# Altium footprint library Elettronica FM.PcbLib: 387 footprints (part 11 of 25)
Each footprint in its own frame and in the unit in brackets; x right, y up, seen from the top. Pads: shape width x height; smd on the part's side, far side on the other; paste and mask are expansions set on the pad; w line width, h text height; cw(c..) or ccw(c..) is an arc to the next point about the centre after c.
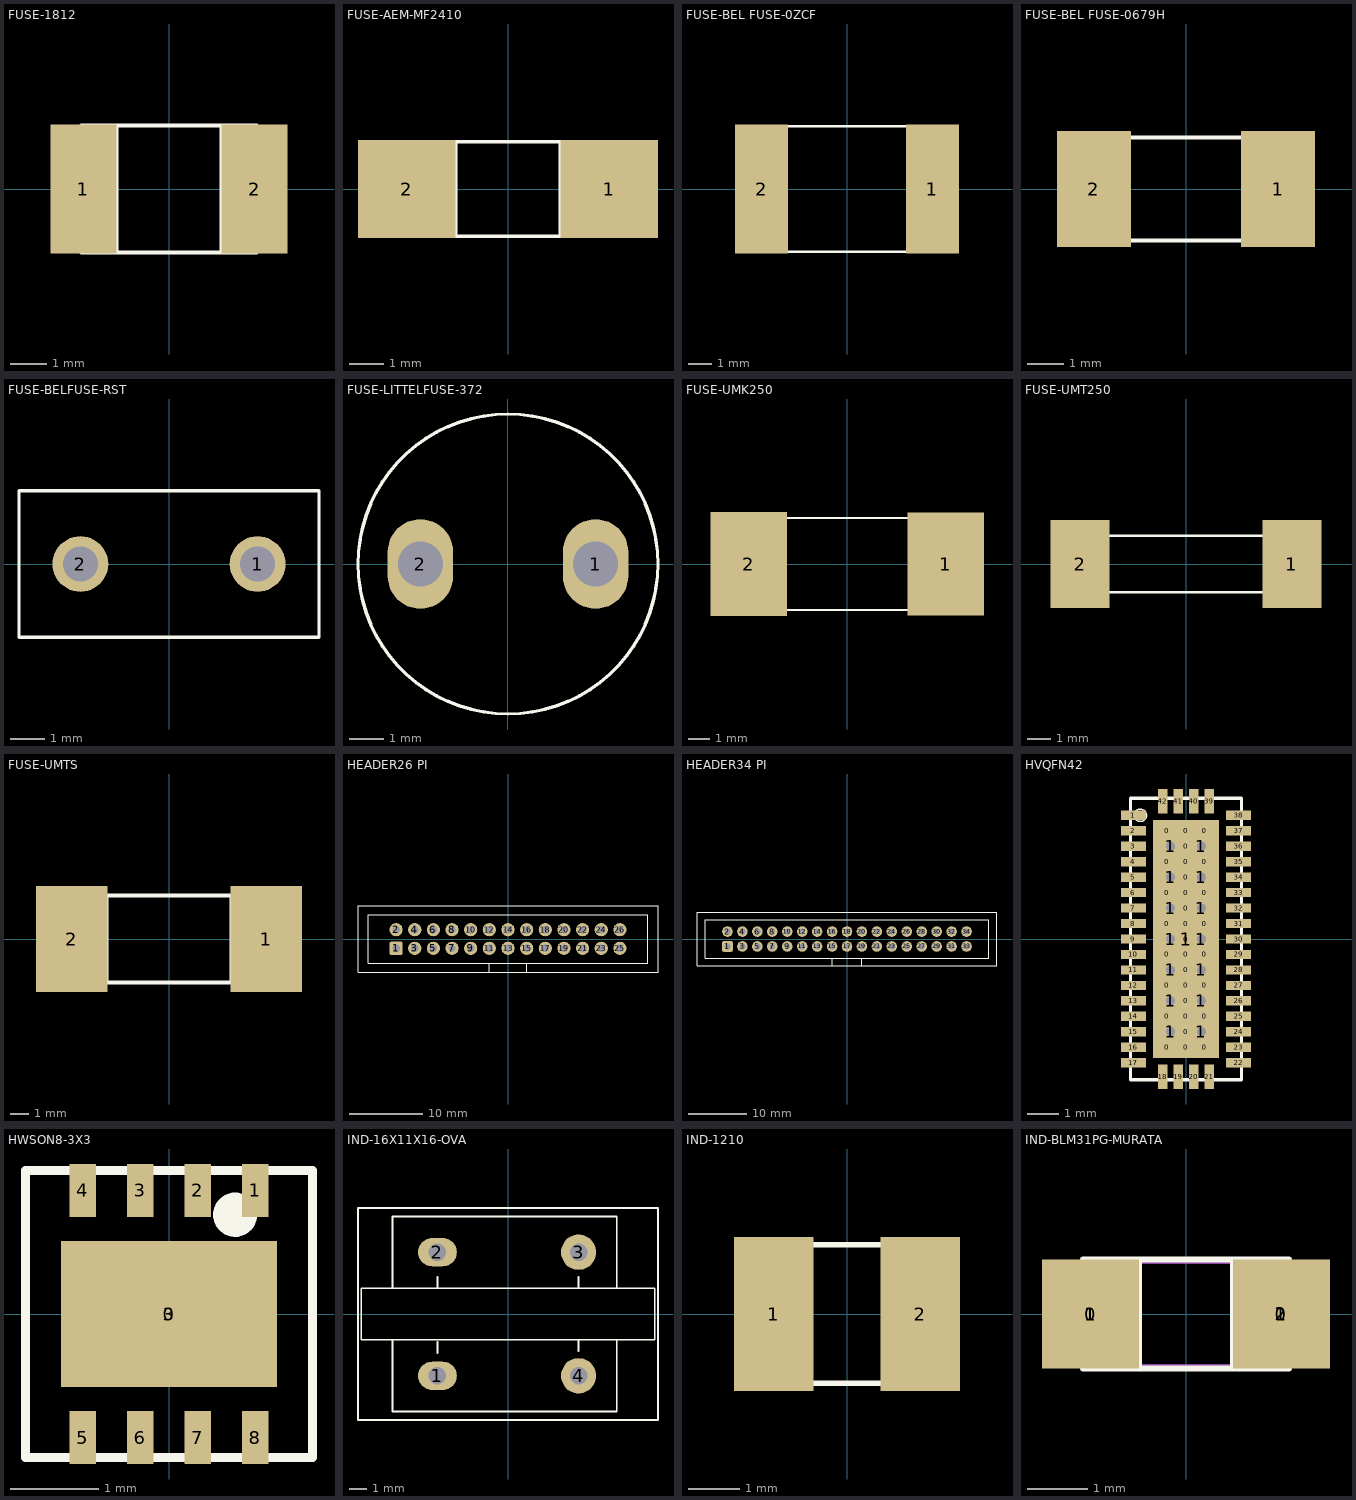
[diagram p10: the footprints below, top view; thin cyan lines are the x and y axes]

## FUSE-1812 [mm]
height 16.6
pads (2):
  rect 1.8x3.5 smd paste-0.05: 1(-2.325,0) 2(2.325,0)
Top Overlay:
  lines w0.1: -1.425,-1.725 -1.425,1.725 ; 1.425,-1.725 1.425,1.725 ; -2.375,-1.725 2.375,-1.725 2.375,1.725 -2.375,1.725 -2.375,-1.725

## FUSE-AEM-MF2410 [mm]
height 1.9
pads (2):
  rect 2.8x2.8 smd: 1(2.9,0) 2(-2.9,0)
Top Overlay:
  lines w0.1: -1.5,-1.35 -1.5,1.35 ; 1.5,-1.35 1.5,1.35 ; -3.15,-1.35 3.15,-1.35 3.15,1.35 -3.15,1.35 -3.15,-1.35
3D body: height 2.4, standoff 0, extent -3.15,-1.35 3.15,1.35

## FUSE-BEL FUSE-0ZCF [mm]
height 1.9
pads (2):
  rect 2.3x5.6 smd: 1(3.7,0) 2(-3.7,0)
Top Overlay:
  lines w0.1: -2.8,-2.725 -2.8,2.725 ; 2.8,-2.725 2.8,2.725 ; -4,-2.725 4,-2.725 4,-0.9 cw(c4,0) 4,0.9 4,2.725 -4,2.725 -4,0.9 cw(c-4,0) -4,-0.9 -4,-2.725
3D body: height 1.15, standoff 0, extent -4,-2.725 4,2.725
3D body: height 1.17, standoff 0, extent 2.8,-2.75 4.025,2.75
3D body: height 1.17, standoff 0, extent -4.025,-2.75 -2.8,2.75

## FUSE-BEL FUSE-0679H [mm]
height 1.9
pads (2):
  rect 2x3.15 smd: 1(2.5,0) 2(-2.5,0)
Top Overlay:
  lines w0.1: -1.55,-1.4 -1.55,1.4 ; 1.55,-1.4 1.55,1.4 ; -3.2,-1.4 3.2,-1.4 3.2,1.4 -3.2,1.4 -3.2,-1.4
3D body: height 2.8, standoff 0, extent -3.15,-1.35 3.15,1.35

## FUSE-BELFUSE-RST [mm]
height 8.5
pads (2):
  round 1.6 hole 1: 1(2.54,0) 2(-2.54,0)
Top Overlay:
  lines w0.1: -4.3,-2.1 -4.3,2.1 4.3,2.1 4.3,-2.1 -4.3,-2.1
3D body: height 0.7, standoff -4.3, extent -3.085,-0.549 -1.99,0.549
3D body: height 0.7, standoff -4.3, extent 1.995,-0.549 3.09,0.549

## FUSE-LITTELFUSE-372 [mm]
height 8.5
pads (2):
  oval 1.9x2.6 hole 1.3: 1(2.54,0) 2(-2.54,0)
Top Overlay:
  circle w0.1: c0,0 r4.35
3D body: height 0.7, standoff -4.3, extent -3.085,-0.549 -1.99,0.549
3D body: height 0.7, standoff -4.3, extent 1.995,-0.549 3.09,0.549
3D body: height 8, standoff 0.5, extent -4.35,-4.347 4.35,4.347

## FUSE-UMK250 [mm]
pads (2):
  rect 3.5x4.7 smd: 1(4.5,0)
  rect 3.5x4.75 smd: 2(-4.5,0)
Top Overlay:
  lines w0.1: -5.65,-2.1 5.65,-2.1 5.65,2.1 -5.65,2.1 -5.65,-2.1
3D body "UMK250.STEP": height 4.02, standoff 0.02, extent -5.65,-2.1 5.65,2.1

## FUSE-UMT250 [mm]
pads (2):
  rect 2.5x3.75 smd: 1(4.5,0) 2(-4.5,0)
Top Overlay:
  lines w0.1: -3.45,-1.2 3.45,-1.2 ; -3.45,1.2 3.45,1.2 ; -5.45,-0.7 -5.05,-0.7 -5.05,0.7 -5.45,0.7 -5.45,-0.7 ; -5.05,-1.5 -5.05,1.5 -3.45,1.5 -3.45,-1.5 -5.05,-1.5 ; 3.45,-1.5 3.45,1.5 5.05,1.5 5.05,-1.5 3.45,-1.5 ; 5.05,-0.7 5.05,0.7 5.45,0.7 5.45,-0.7 5.05,-0.7
3D body "UMT250.STEP": height 3, standoff 0, extent -5.45,-1.5 5.45,1.5

## FUSE-UMTS [mm]
pads (2):
  rect 3.8x5.6 smd: 1(5.15,0) 2(-5.15,0)
Top Overlay:
  lines w0.2: -3.3,-2.3 -3.3,2.3 ; 3.3,-2.3 3.3,2.3 ; -6.1,-2.3 6.1,-2.3 6.1,2.3 -6.1,2.3 -6.1,-2.3

## HEADER26 PI [mm]
pads (26):
  rrect25% 1.8x1.8 hole 1: 1(-15.24,-1.27)
  round 1.8 hole 1: 2(-15.24,1.27) 3(-12.7,-1.27) 4(-12.7,1.27) 5(-10.16,-1.27) 6(-10.16,1.27) 7(-7.62,-1.27) 8(-7.62,1.27) 9(-5.08,-1.27) 10(-5.08,1.27) 11(-2.54,-1.27) 12(-2.54,1.27) 13(0,-1.27) 14(0,1.27) 15(2.54,-1.27) 16(2.54,1.27) 17(5.08,-1.27) 18(5.08,1.27) 19(7.62,-1.27) 20(7.62,1.27) 21(10.16,-1.27) 22(10.16,1.27) 23(12.7,-1.27) 24(12.7,1.27) 25(15.24,-1.27) 26(15.24,1.27)
Top Overlay:
  lines w0.1: -2.54,-4.55 2.54,-4.55 ; -2.54,-4.55 -20.425,-4.55 -20.425,4.55 20.425,4.55 20.425,-4.55 2.54,-4.55 ; -2.54,-4.55 -2.54,-3.302 2.54,-3.302 2.54,-4.55 ; -19.05,-3.302 -8.89,-3.302 19.05,-3.302 19.05,3.302 -19.05,3.302 -19.05,-3.302
3D body "702462601.stp": height 9.25, standoff -3.44, extent -20.32,-4.445 20.32,4.445

## HEADER34 PI [mm]
pads (34):
  rrect25% 1.8x1.8 hole 1: 1(-20.32,-1.27)
  round 1.8 hole 1: 2(-20.32,1.27) 3(-17.78,-1.27) 4(-17.78,1.27) 5(-15.24,-1.27) 6(-15.24,1.27) 7(-12.7,-1.27) 8(-12.7,1.27) 9(-10.16,-1.27) 10(-10.16,1.27) 11(-7.62,-1.27) 12(-7.62,1.27) 13(-5.08,-1.27) 14(-5.08,1.27) 15(-2.54,-1.27) 16(-2.54,1.27) 17(0,-1.27) 18(0,1.27) 19(2.54,-1.27) 20(2.54,1.27) 21(5.08,-1.27) 22(5.08,1.27) 23(7.62,-1.27) 24(7.62,1.27) 25(10.16,-1.27) 26(10.16,1.27) 27(12.7,-1.27) 28(12.7,1.27) 29(15.24,-1.27) 30(15.24,1.27) 31(17.78,-1.27) 32(17.78,1.27) 33(20.32,-1.27) 34(20.32,1.27)
Top Overlay:
  lines w0.1: -2.54,-4.55 -2.54,-3.302 2.54,-3.302 2.54,-4.55 ; -2.54,-4.55 -25.505,-4.55 -25.505,4.55 25.505,4.55 25.505,-4.55 2.54,-4.55 ; -2.54,-4.55 2.54,-4.55 ; -24.13,-3.302 -24.13,3.302 24.13,3.302 24.13,-3.302 -8.89,-3.302 -24.13,-3.302
3D body "702463401.stp": height 9.25, standoff -3.44, extent -25.4,-4.445 25.4,4.445

## HVQFN42 [mm]
pads (88):
  rect 0.4x0.3 on Top Paste mask+0.05: 0(-0.6,-3.5) 0(-0.6,-2.5) 0(-0.6,-1.5) 0(-0.6,-0.5) 0(-0.6,0.5) 0(-0.6,1.5) 0(-0.6,2.5) 0(-0.6,3.5) 0(0,-3.5) 0(0,-3) 0(0,-2.5) 0(0,-2) 0(0,-1.5) 0(0,-1) 0(0,-0.5) 0(0,0) 0(0,0.5) 0(0,1) 0(0,1.5) 0(0,2) 0(0,2.5) 0(0,3) 0(0,3.5) 0(0.6,-3.5) 0(0.6,-2.5) 0(0.6,-1.5) 0(0.6,-0.5) 0(0.6,0.5) 0(0.6,1.5) 0(0.6,2.5) 0(0.6,3.5)
  rect 0.8x0.3 smd mask+0.05: 1(-1.7,4) 2(-1.7,3.5) 3(-1.7,3) 4(-1.7,2.5) 5(-1.7,2) 6(-1.7,1.5) 7(-1.7,1) 8(-1.7,0.5) 9(-1.7,0) 10(-1.7,-0.5) 11(-1.7,-1) 12(-1.7,-1.5) 13(-1.7,-2) 14(-1.7,-2.5) 15(-1.7,-3) 16(-1.7,-3.5) 17(-1.7,-4) 22(1.7,-4) 23(1.7,-3.5) 24(1.7,-3) 25(1.7,-2.5) 26(1.7,-2) 27(1.7,-1.5) 28(1.7,-1) 29(1.7,-0.5) 30(1.7,0) 31(1.7,0.5) 32(1.7,1) 33(1.7,1.5) 34(1.7,2) 35(1.7,2.5) 36(1.7,3) 37(1.7,3.5) 38(1.7,4)
  round 0.7 hole 0.3 mask-0.15: 1(-0.5,-3) 1(-0.5,-2) 1(-0.5,-1) 1(-0.5,0) 1(-0.5,1) 1(-0.5,2) 1(-0.5,3) 1(0.5,-3) 1(0.5,-2) 1(0.5,-1) 1(0.5,0) 1(0.5,1) 1(0.5,2) 1(0.5,3)
  rect 2.15x7.7 smd paste-50 mask+0.05: 1(0,0)
  rect 0.3x0.8 smd mask+0.05: 18(-0.75,-4.45) 19(-0.25,-4.45) 20(0.25,-4.45) 21(0.75,-4.45) 39(0.75,4.45) 40(0.25,4.45) 41(-0.25,4.45) 42(-0.75,4.45)
Top Overlay:
  circle w0.05: c-1.475,4 r0.2
  lines w0.1: -1.8,-4.55 1.8,-4.55 1.8,4.55 -1.8,4.55 -1.8,-4.55

## HWSON8-3X3 [mm]
height 1.9
pads (10):
  rect 2.45x1.65 smd paste-100: 0(0,0)
  rect 0.3x0.6 smd: 1(0.975,1.4) 2(0.325,1.4) 3(-0.325,1.4) 4(-0.975,1.4) 5(-0.975,-1.4) 6(-0.325,-1.4) 7(0.325,-1.4) 8(0.975,-1.4)
  rect 1.1x0.65 on Top Paste mask+0.1: 3(0,0)
Top Overlay:
  circle w0.3: c0.75,1.125 r0.1
  lines w0.1: -1.625,-1.625 1.625,-1.625 1.625,1.625 -1.625,1.625 -1.625,-1.625
3D body "User Library-HVSON-8.STEP": height 1, standoff 0, extent -1.49,-1.5 1.49,1.5

## IND-16X11X16-OVA [mm]
pads (4):
  oval 2.2x1.6 hole 1: 1(-4,-3.5) 2(-4,3.5)
  round 2 hole 1: 3(4,3.5) 4(4,-3.5)
Top Overlay:
  lines w0.1: -8.191,1.46 8.319,1.46 ; -4,-2.223 -4,-1.587 ; -4,1.46 -4,2.095 ; 4,-2.095 4,-1.46 ; 4,1.46 4,2.095 ; -8.319,-1.46 8.318,-1.46 ; -8.319,-1.46 -8.319,1.46 -6.54,1.46 -6.54,5.524 6.159,5.524 6.159,1.46 8.319,1.46 ; -8.319,-1.46 -6.541,-1.46 -6.54,-5.524 6.16,-5.524 6.16,-1.46 8.318,-1.46 ; 8.318,-1.46 8.319,1.46 ; -8.5,-6 8.5,-6 8.5,6 -8.5,6 -8.5,-6
3D body: height 1.8, standoff -3.2, extent -4.3,-3.792 -3.703,-3.193
3D body: height 1.8, standoff -3.2, extent 3.701,-3.792 4.298,-3.193
3D body: height 1.8, standoff -3.2, extent 3.701,3.193 4.298,3.792
3D body: height 1.8, standoff -3.2, extent -4.3,3.193 -3.703,3.792
3D body: height 17.2, standoff 4.5, extent -8.319,-1.46 8.319,1.46
3D body: height 13.2, standoff 1.8, extent -6.54,-5.524 6.16,5.524

## IND-1210 [mm]
pads (2):
  rect 1.55x3 smd: 1(-1.425,0) 2(1.425,0)
Top Overlay:
  lines w0.1: -0.8,-1.35 -0.8,1.35 ; 0.8,-1.35 0.8,1.35 ; -1.75,-1.35 1.75,-1.35 1.75,1.35 -1.75,1.35 -1.75,-1.35
3D body: height 2.2, standoff 0, extent -1.75,-1.35 1.75,1.35

## IND-BLM31PG-MURATA [mm]
height 1.9
pads (6):
  rect 1.6x1.2 on Top Solder paste+0 mask+0.05: 0(-1.575,0) 0(1.575,0)
  rect 1.6x1.8 smd paste-5 mask-5: 1(-1.575,0) 2(1.575,0)
  rect 1.5x1.1 on Top Paste paste+0 mask+0.05: 1(-1.575,0) 1(1.575,0)
Top Overlay:
  lines w0.1: -0.775,-0.9 -0.775,0.9 ; 0.775,-0.9 0.775,0.9 ; -1.7,-0.9 1.7,-0.9 1.7,0.9 -1.7,0.9 -1.7,-0.9
Mechanical 3:
  lines w0.1: -1.65,-0.875 -1.65,0.875 1.65,0.875 1.65,-0.875 -1.65,-0.875
3D body: height 1.3, standoff 0, extent -1.7,-0.9 1.7,0.9